# Altium schematic symbol library jlcpcb_2025_04_capacitors_extended_0402.schlib: 3594 symbols (part 16 of 20) (continued)
## GRM1555C1H111JA01D
designator C?  Capacitance: 110pF  (hidden comment: *)
Capacitor, Ceramic (MLCC), 110pF, ±5%, 50V, null, ±5%, SMD 0402; Manufacturer: Murata Electronics; Manufacturer Part Number: GRM1555C1H111JA01D; Package Size: 0402; JLCPCB Basic Part: No; JLCPCB Part Number: C185562; Supplier 1: LCSC; Category: Capacitors - MLCC; Supplier Part Number 1: C185562; Tolerance: ±5%; Voltage Rating: 50V; Temperature Coefficient: null; RoHS: Yes; ComponentLink1Description: Datasheet; ComponentLink1URL: https://wmsc.lcsc.com/wmsc/upload/file/pdf/v2/lcsc/2105241135_Murata-Electronics-GRM1555C1H111JA01D_C185562.pdf; ComponentLink2Description: JLCPCB Part URL; ComponentLink2URL: https://jlcpcb.com/partdetail/C185562; ComponentLink3Description: LCSC Part URL; ComponentLink3URL: https://lcsc.com/product-detail/Multilayer-Ceramic-Capacitors-MLCC---SMD-SMT_Murata-Electronics-Murata-Electronics-GRM1555C1H111JA01D_C185562.html
footprint CAP-0402 (0402 (1005M) Capacitor)
pins: 1, 2

## GRM1555C1H120GA01D
designator C?  Capacitance: 12pF  (hidden comment: *)
Capacitor, Ceramic (MLCC), 12pF, ±2%, 50V, null, ±2%, SMD 0402; Manufacturer: Murata Electronics; Manufacturer Part Number: GRM1555C1H120GA01D; Package Size: 0402; JLCPCB Basic Part: No; JLCPCB Part Number: C161527; Supplier 1: LCSC; Category: Capacitors - MLCC; Supplier Part Number 1: C161527; Tolerance: ±2%; Voltage Rating: 50V; Temperature Coefficient: null; RoHS: Yes; ComponentLink1Description: Datasheet; ComponentLink1URL: https://wmsc.lcsc.com/wmsc/upload/file/pdf/v2/lcsc/2010101433_Murata-Electronics-GRM1555C1H120GA01D_C161527.pdf; ComponentLink2Description: JLCPCB Part URL; ComponentLink2URL: https://jlcpcb.com/partdetail/C161527; ComponentLink3Description: LCSC Part URL; ComponentLink3URL: https://lcsc.com/product-detail/Multilayer-Ceramic-Capacitors-MLCC---SMD-SMT_Murata-Electronics-Murata-Electronics-GRM1555C1H120GA01D_C161527.html
footprint CAP-0402 (0402 (1005M) Capacitor)
pins: 1, 2

## GRM1555C1H120JA01D
designator C?  Capacitance: 12pF  (hidden comment: *)
Capacitor, Ceramic (MLCC), 12pF, ±5%, 50V, C0G, ±5%, SMD 0402; Manufacturer: Murata Electronics; Manufacturer Part Number: GRM1555C1H120JA01D; Package Size: 0402; JLCPCB Basic Part: No; JLCPCB Part Number: C76948; Supplier 1: LCSC; Category: Capacitors - MLCC; Supplier Part Number 1: C76948; Tolerance: ±5%; Voltage Rating: 50V; Temperature Coefficient: C0G; RoHS: Yes; ComponentLink1Description: Datasheet; ComponentLink1URL: https://wmsc.lcsc.com/wmsc/upload/file/pdf/v2/lcsc/1811081610_Murata-Electronics-GRM1555C1H120JA01D_C76948.pdf; ComponentLink2Description: JLCPCB Part URL; ComponentLink2URL: https://jlcpcb.com/partdetail/C76948; ComponentLink3Description: LCSC Part URL; ComponentLink3URL: https://lcsc.com/product-detail/Multilayer-Ceramic-Capacitors-MLCC---SMD-SMT_Murata-Electronics-Murata-Electronics-GRM1555C1H120JA01D_C76948.html
footprint CAP-0402 (0402 (1005M) Capacitor)
pins: 1, 2

## GRM1555C1H121FA01D
designator C?  Capacitance: 120pF  (hidden comment: *)
Capacitor, Ceramic (MLCC), 120pF, ±1%, null, null, ±1%, SMD 0402; Manufacturer: Murata Electronics; Manufacturer Part Number: GRM1555C1H121FA01D; Package Size: 0402; JLCPCB Basic Part: No; JLCPCB Part Number: C440164; Supplier 1: LCSC; Category: Capacitors - MLCC; Supplier Part Number 1: C440164; Tolerance: ±1%; Voltage Rating: null; Temperature Coefficient: null; RoHS: Yes; ComponentLink1Description: Datasheet; ComponentLink1URL: https://wmsc.lcsc.com/wmsc/upload/file/pdf/v2/lcsc/2304140030_Murata-Electronics-GRM1555C1H121FA01D_C440164.pdf; ComponentLink2Description: JLCPCB Part URL; ComponentLink2URL: https://jlcpcb.com/partdetail/C440164; ComponentLink3Description: LCSC Part URL; ComponentLink3URL: https://lcsc.com/product-detail/Multilayer-Ceramic-Capacitors-MLCC---SMD-SMT_Murata-Electronics-Murata-Electronics-GRM1555C1H121FA01D_C440164.html
footprint CAP-0402 (0402 (1005M) Capacitor)
pins: 1, 2

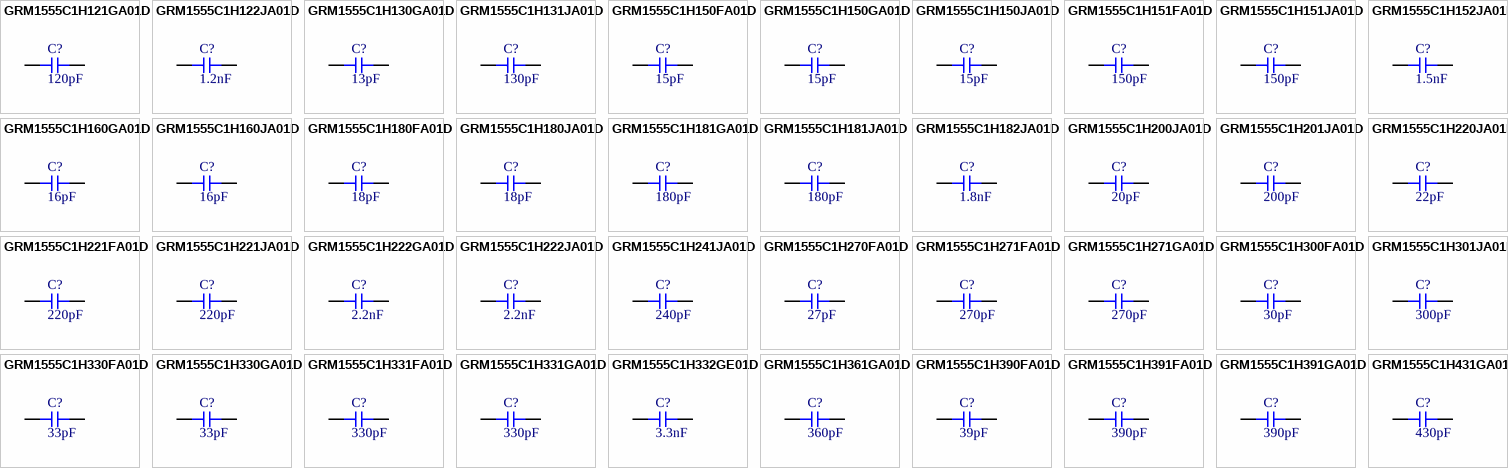
[diagram p73: symbols GRM1555C1H121GA01D to GRM1555C1H431GA01D]

## GRM1555C1H121GA01D
designator C?  Capacitance: 120pF  (hidden comment: *)
Capacitor, Ceramic (MLCC), 120pF, ±2%, null, null, ±2%, SMD 0402; Manufacturer: Murata Electronics; Manufacturer Part Number: GRM1555C1H121GA01D; Package Size: 0402; JLCPCB Basic Part: No; JLCPCB Part Number: C440165; Supplier 1: LCSC; Category: Capacitors - MLCC; Supplier Part Number 1: C440165; Tolerance: ±2%; Voltage Rating: null; Temperature Coefficient: null; RoHS: Yes; ComponentLink1Description: Datasheet; ComponentLink1URL: https://wmsc.lcsc.com/wmsc/upload/file/pdf/v2/lcsc/2304140030_Murata-Electronics-GRM1555C1H121GA01D_C440165.pdf; ComponentLink2Description: JLCPCB Part URL; ComponentLink2URL: https://jlcpcb.com/partdetail/C440165; ComponentLink3Description: LCSC Part URL; ComponentLink3URL: https://lcsc.com/product-detail/Multilayer-Ceramic-Capacitors-MLCC---SMD-SMT_Murata-Electronics-Murata-Electronics-GRM1555C1H121GA01D_C440165.html
footprint CAP-0402 (0402 (1005M) Capacitor)
pins: 1, 2

## GRM1555C1H122JA01D
designator C?  Capacitance: 1.2nF  (hidden comment: *)
Capacitor, Ceramic (MLCC), 1.2nF, ±5%, 50V, C0G, ±5%, SMD 0402; Manufacturer: Murata Electronics; Manufacturer Part Number: GRM1555C1H122JA01D; Package Size: 0402; JLCPCB Basic Part: No; JLCPCB Part Number: C3010430; Supplier 1: LCSC; Category: Capacitors - MLCC; Supplier Part Number 1: C3010430; Tolerance: ±5%; Voltage Rating: 50V; Temperature Coefficient: C0G; RoHS: Yes; ComponentLink1Description: Datasheet; ComponentLink1URL: https://wmsc.lcsc.com/wmsc/upload/file/pdf/v2/lcsc/2205101730_Murata-Electronics-GRM1555C1H122JA01D_C3010430.pdf; ComponentLink2Description: JLCPCB Part URL; ComponentLink2URL: https://jlcpcb.com/partdetail/C3010430; ComponentLink3Description: LCSC Part URL; ComponentLink3URL: https://lcsc.com/product-detail/Multilayer-Ceramic-Capacitors-MLCC---SMD-SMT_Murata-Electronics-Murata-Electronics-GRM1555C1H122JA01D_C3010430.html
footprint CAP-0402 (0402 (1005M) Capacitor)
pins: 1, 2

## GRM1555C1H130GA01D
designator C?  Capacitance: 13pF  (hidden comment: *)
Capacitor, Ceramic (MLCC), 13pF, ±2%, 50V, C0G, ±2%, SMD 0402; Manufacturer: Murata Electronics; Manufacturer Part Number: GRM1555C1H130GA01D; Package Size: 0402; JLCPCB Basic Part: No; JLCPCB Part Number: C161528; Supplier 1: LCSC; Category: Capacitors - MLCC; Supplier Part Number 1: C161528; Tolerance: ±2%; Voltage Rating: 50V; Temperature Coefficient: C0G; RoHS: Yes; ComponentLink1Description: Datasheet; ComponentLink1URL: https://wmsc.lcsc.com/wmsc/upload/file/pdf/v2/lcsc/2304140030_Murata-Electronics-GRM1555C1H130GA01D_C161528.pdf; ComponentLink2Description: JLCPCB Part URL; ComponentLink2URL: https://jlcpcb.com/partdetail/C161528; ComponentLink3Description: LCSC Part URL; ComponentLink3URL: https://lcsc.com/product-detail/Multilayer-Ceramic-Capacitors-MLCC---SMD-SMT_Murata-Electronics-Murata-Electronics-GRM1555C1H130GA01D_C161528.html
footprint CAP-0402 (0402 (1005M) Capacitor)
pins: 1, 2

## GRM1555C1H131JA01D
designator C?  Capacitance: 130pF  (hidden comment: *)
Capacitor, Ceramic (MLCC), 130pF, ±5%, null, null, ±5%, SMD 0402; Manufacturer: Murata Electronics; Manufacturer Part Number: GRM1555C1H131JA01D; Package Size: 0402; JLCPCB Basic Part: No; JLCPCB Part Number: C882544; Supplier 1: LCSC; Category: Capacitors - MLCC; Supplier Part Number 1: C882544; Tolerance: ±5%; Voltage Rating: null; Temperature Coefficient: null; RoHS: Yes; ComponentLink1Description: Datasheet; ComponentLink1URL: https://wmsc.lcsc.com/wmsc/upload/file/pdf/v2/lcsc/2201242130_Murata-Electronics-GRM1555C1H131JA01D_C882544.pdf; ComponentLink2Description: JLCPCB Part URL; ComponentLink2URL: https://jlcpcb.com/partdetail/C882544; ComponentLink3Description: LCSC Part URL; ComponentLink3URL: https://lcsc.com/product-detail/Multilayer-Ceramic-Capacitors-MLCC---SMD-SMT_Murata-Electronics-Murata-Electronics-GRM1555C1H131JA01D_C882544.html
footprint CAP-0402 (0402 (1005M) Capacitor)
pins: 1, 2

## GRM1555C1H150FA01D
designator C?  Capacitance: 15pF  (hidden comment: *)
Capacitor, Ceramic (MLCC), 15pF, ±1%, 50V, null, ±1%, SMD 0402; Manufacturer: Murata Electronics; Manufacturer Part Number: GRM1555C1H150FA01D; Package Size: 0402; JLCPCB Basic Part: No; JLCPCB Part Number: C161530; Supplier 1: LCSC; Category: Capacitors - MLCC; Supplier Part Number 1: C161530; Tolerance: ±1%; Voltage Rating: 50V; Temperature Coefficient: null; RoHS: Yes; ComponentLink1Description: Datasheet; ComponentLink1URL: https://wmsc.lcsc.com/wmsc/upload/file/pdf/v2/lcsc/2105241135_Murata-Electronics-GRM1555C1H150FA01D_C161530.pdf; ComponentLink2Description: JLCPCB Part URL; ComponentLink2URL: https://jlcpcb.com/partdetail/C161530; ComponentLink3Description: LCSC Part URL; ComponentLink3URL: https://lcsc.com/product-detail/Multilayer-Ceramic-Capacitors-MLCC---SMD-SMT_Murata-Electronics-Murata-Electronics-GRM1555C1H150FA01D_C161530.html
footprint CAP-0402 (0402 (1005M) Capacitor)
pins: 1, 2

## GRM1555C1H150GA01D
designator C?  Capacitance: 15pF  (hidden comment: *)
Capacitor, Ceramic (MLCC), 15pF, ±2%, 50V, null, ±2%, SMD 0402; Manufacturer: Murata Electronics; Manufacturer Part Number: GRM1555C1H150GA01D; Package Size: 0402; JLCPCB Basic Part: No; JLCPCB Part Number: C161531; Supplier 1: LCSC; Category: Capacitors - MLCC; Supplier Part Number 1: C161531; Tolerance: ±2%; Voltage Rating: 50V; Temperature Coefficient: null; RoHS: Yes; ComponentLink1Description: Datasheet; ComponentLink1URL: https://wmsc.lcsc.com/wmsc/upload/file/pdf/v2/lcsc/2105241135_Murata-Electronics-GRM1555C1H150GA01D_C161531.pdf; ComponentLink2Description: JLCPCB Part URL; ComponentLink2URL: https://jlcpcb.com/partdetail/C161531; ComponentLink3Description: LCSC Part URL; ComponentLink3URL: https://lcsc.com/product-detail/Multilayer-Ceramic-Capacitors-MLCC---SMD-SMT_Murata-Electronics-Murata-Electronics-GRM1555C1H150GA01D_C161531.html
footprint CAP-0402 (0402 (1005M) Capacitor)
pins: 1, 2

## GRM1555C1H150JA01D
designator C?  Capacitance: 15pF  (hidden comment: *)
Capacitor, Ceramic (MLCC), 15pF, ±5%, 50V, C0G, ±5%, SMD 0402; Manufacturer: Murata Electronics; Manufacturer Part Number: GRM1555C1H150JA01D; Package Size: 0402; JLCPCB Basic Part: No; JLCPCB Part Number: C76950; Supplier 1: LCSC; Category: Capacitors - MLCC; Supplier Part Number 1: C76950; Tolerance: ±5%; Voltage Rating: 50V; Temperature Coefficient: C0G; RoHS: Yes; ComponentLink1Description: Datasheet; ComponentLink1URL: https://wmsc.lcsc.com/wmsc/upload/file/pdf/v2/lcsc/1811081611_Murata-Electronics-GRM1555C1H150JA01D_C76950.pdf; ComponentLink2Description: JLCPCB Part URL; ComponentLink2URL: https://jlcpcb.com/partdetail/C76950; ComponentLink3Description: LCSC Part URL; ComponentLink3URL: https://lcsc.com/product-detail/Multilayer-Ceramic-Capacitors-MLCC---SMD-SMT_Murata-Electronics-Murata-Electronics-GRM1555C1H150JA01D_C76950.html
footprint CAP-0402 (0402 (1005M) Capacitor)
pins: 1, 2

## GRM1555C1H151FA01D
designator C?  Capacitance: 150pF  (hidden comment: *)
Capacitor, Ceramic (MLCC), 150pF, ±1%, 50V, C0G, ±1%, SMD 0402; Manufacturer: Murata Electronics; Manufacturer Part Number: GRM1555C1H151FA01D; Package Size: 0402; JLCPCB Basic Part: No; JLCPCB Part Number: C237333; Supplier 1: LCSC; Category: Capacitors - MLCC; Supplier Part Number 1: C237333; Tolerance: ±1%; Voltage Rating: 50V; Temperature Coefficient: C0G; RoHS: Yes; ComponentLink1Description: Datasheet; ComponentLink1URL: https://wmsc.lcsc.com/wmsc/upload/file/pdf/v2/lcsc/2304140030_Murata-Electronics-GRM1555C1H151FA01D_C237333.pdf; ComponentLink2Description: JLCPCB Part URL; ComponentLink2URL: https://jlcpcb.com/partdetail/C237333; ComponentLink3Description: LCSC Part URL; ComponentLink3URL: https://lcsc.com/product-detail/Multilayer-Ceramic-Capacitors-MLCC---SMD-SMT_Murata-Electronics-Murata-Electronics-GRM1555C1H151FA01D_C237333.html
footprint CAP-0402 (0402 (1005M) Capacitor)
pins: 1, 2

## GRM1555C1H151JA01D
designator C?  Capacitance: 150pF  (hidden comment: *)
Capacitor, Ceramic (MLCC), 150pF, ±5%, 50V, C0G, ±5%, SMD 0402; Manufacturer: Murata Electronics; Manufacturer Part Number: GRM1555C1H151JA01D; Package Size: 0402; JLCPCB Basic Part: No; JLCPCB Part Number: C76951; Supplier 1: LCSC; Category: Capacitors - MLCC; Supplier Part Number 1: C76951; Tolerance: ±5%; Voltage Rating: 50V; Temperature Coefficient: C0G; RoHS: Yes; ComponentLink1Description: Datasheet; ComponentLink1URL: https://wmsc.lcsc.com/wmsc/upload/file/pdf/v2/lcsc/1811081611_Murata-Electronics-GRM1555C1H151JA01D_C76951.pdf; ComponentLink2Description: JLCPCB Part URL; ComponentLink2URL: https://jlcpcb.com/partdetail/C76951; ComponentLink3Description: LCSC Part URL; ComponentLink3URL: https://lcsc.com/product-detail/Multilayer-Ceramic-Capacitors-MLCC---SMD-SMT_Murata-Electronics-Murata-Electronics-GRM1555C1H151JA01D_C76951.html
footprint CAP-0402 (0402 (1005M) Capacitor)
pins: 1, 2

## GRM1555C1H152JA01D
designator C?  Capacitance: 1.5nF  (hidden comment: *)
Capacitor, Ceramic (MLCC), 1.5nF, ±5%, null, null, ±5%, SMD 0402; Manufacturer: Murata Electronics; Manufacturer Part Number: GRM1555C1H152JA01D; Package Size: 0402; JLCPCB Basic Part: No; JLCPCB Part Number: C668348; Supplier 1: LCSC; Category: Capacitors - MLCC; Supplier Part Number 1: C668348; Tolerance: ±5%; Voltage Rating: null; Temperature Coefficient: null; RoHS: Yes; ComponentLink1Description: Datasheet; ComponentLink1URL: https://wmsc.lcsc.com/wmsc/upload/file/pdf/v2/lcsc/2201131030_Murata-Electronics-GRM1555C1H152JA01D_C668348.pdf; ComponentLink2Description: JLCPCB Part URL; ComponentLink2URL: https://jlcpcb.com/partdetail/C668348; ComponentLink3Description: LCSC Part URL; ComponentLink3URL: https://lcsc.com/product-detail/Multilayer-Ceramic-Capacitors-MLCC---SMD-SMT_Murata-Electronics-Murata-Electronics-GRM1555C1H152JA01D_C668348.html
footprint CAP-0402 (0402 (1005M) Capacitor)
pins: 1, 2

## GRM1555C1H160GA01D
designator C?  Capacitance: 16pF  (hidden comment: *)
Capacitor, Ceramic (MLCC), 16pF, ±2%, 50V, C0G, ±2%, SMD 0402; Manufacturer: Murata Electronics; Manufacturer Part Number: GRM1555C1H160GA01D; Package Size: 0402; JLCPCB Basic Part: No; JLCPCB Part Number: C161533; Supplier 1: LCSC; Category: Capacitors - MLCC; Supplier Part Number 1: C161533; Tolerance: ±2%; Voltage Rating: 50V; Temperature Coefficient: C0G; RoHS: Yes; ComponentLink1Description: Datasheet; ComponentLink1URL: https://wmsc.lcsc.com/wmsc/upload/file/pdf/v2/lcsc/2304140030_Murata-Electronics-GRM1555C1H160GA01D_C161533.pdf; ComponentLink2Description: JLCPCB Part URL; ComponentLink2URL: https://jlcpcb.com/partdetail/C161533; ComponentLink3Description: LCSC Part URL; ComponentLink3URL: https://lcsc.com/product-detail/Multilayer-Ceramic-Capacitors-MLCC---SMD-SMT_Murata-Electronics-Murata-Electronics-GRM1555C1H160GA01D_C161533.html
footprint CAP-0402 (0402 (1005M) Capacitor)
pins: 1, 2

## GRM1555C1H160JA01D
designator C?  Capacitance: 16pF  (hidden comment: *)
Capacitor, Ceramic (MLCC), 16pF, ±5%, 50V, C0G, ±5%, SMD 0402; Manufacturer: Murata Electronics; Manufacturer Part Number: GRM1555C1H160JA01D; Package Size: 0402; JLCPCB Basic Part: No; JLCPCB Part Number: C85936; Supplier 1: LCSC; Category: Capacitors - MLCC; Supplier Part Number 1: C85936; Tolerance: ±5%; Voltage Rating: 50V; Temperature Coefficient: C0G; RoHS: Yes; ComponentLink1Description: Datasheet; ComponentLink1URL: https://wmsc.lcsc.com/wmsc/upload/file/pdf/v2/lcsc/2304140030_Murata-Electronics-GRM1555C1H160JA01D_C85936.pdf; ComponentLink2Description: JLCPCB Part URL; ComponentLink2URL: https://jlcpcb.com/partdetail/C85936; ComponentLink3Description: LCSC Part URL; ComponentLink3URL: https://lcsc.com/product-detail/Multilayer-Ceramic-Capacitors-MLCC---SMD-SMT_Murata-Electronics-Murata-Electronics-GRM1555C1H160JA01D_C85936.html
footprint CAP-0402 (0402 (1005M) Capacitor)
pins: 1, 2

## GRM1555C1H180FA01D
designator C?  Capacitance: 18pF  (hidden comment: *)
Capacitor, Ceramic (MLCC), 18pF, ±1%, 50V, C0G, ±1%, SMD 0402; Manufacturer: Murata Electronics; Manufacturer Part Number: GRM1555C1H180FA01D; Package Size: 0402; JLCPCB Basic Part: No; JLCPCB Part Number: C161534; Supplier 1: LCSC; Category: Capacitors - MLCC; Supplier Part Number 1: C161534; Tolerance: ±1%; Voltage Rating: 50V; Temperature Coefficient: C0G; RoHS: Yes; ComponentLink1Description: Datasheet; ComponentLink1URL: https://wmsc.lcsc.com/wmsc/upload/file/pdf/v2/lcsc/1811081513_Murata-Electronics-GRM1555C1H180FA01D_C161534.pdf; ComponentLink2Description: JLCPCB Part URL; ComponentLink2URL: https://jlcpcb.com/partdetail/C161534; ComponentLink3Description: LCSC Part URL; ComponentLink3URL: https://lcsc.com/product-detail/Multilayer-Ceramic-Capacitors-MLCC---SMD-SMT_Murata-Electronics-Murata-Electronics-GRM1555C1H180FA01D_C161534.html
footprint CAP-0402 (0402 (1005M) Capacitor)
pins: 1, 2

## GRM1555C1H180JA01D
designator C?  Capacitance: 18pF  (hidden comment: *)
Capacitor, Ceramic (MLCC), 18pF, ±5%, 50V, C0G, ±5%, SMD 0402; Manufacturer: Murata Electronics; Manufacturer Part Number: GRM1555C1H180JA01D; Package Size: 0402; JLCPCB Basic Part: No; JLCPCB Part Number: C33149; Supplier 1: LCSC; Category: Capacitors - MLCC; Supplier Part Number 1: C33149; Tolerance: ±5%; Voltage Rating: 50V; Temperature Coefficient: C0G; RoHS: Yes; ComponentLink1Description: Datasheet; ComponentLink1URL: https://wmsc.lcsc.com/wmsc/upload/file/pdf/v2/lcsc/1811081612_Murata-Electronics-GRM1555C1H180JA01D_C33149.pdf; ComponentLink2Description: JLCPCB Part URL; ComponentLink2URL: https://jlcpcb.com/partdetail/C33149; ComponentLink3Description: LCSC Part URL; ComponentLink3URL: https://lcsc.com/product-detail/Multilayer-Ceramic-Capacitors-MLCC---SMD-SMT_Murata-Electronics-Murata-Electronics-GRM1555C1H180JA01D_C33149.html
footprint CAP-0402 (0402 (1005M) Capacitor)
pins: 1, 2

## GRM1555C1H181GA01D
designator C?  Capacitance: 180pF  (hidden comment: *)
Capacitor, Ceramic (MLCC), 180pF, ±2%, 50V, C0G, ±2%, SMD 0402; Manufacturer: Murata Electronics; Manufacturer Part Number: GRM1555C1H181GA01D; Package Size: 0402; JLCPCB Basic Part: No; JLCPCB Part Number: C237508; Supplier 1: LCSC; Category: Capacitors - MLCC; Supplier Part Number 1: C237508; Tolerance: ±2%; Voltage Rating: 50V; Temperature Coefficient: C0G; RoHS: Yes; ComponentLink1Description: Datasheet; ComponentLink1URL: https://wmsc.lcsc.com/wmsc/upload/file/pdf/v2/lcsc/2304140030_Murata-Electronics-GRM1555C1H181GA01D_C237508.pdf; ComponentLink2Description: JLCPCB Part URL; ComponentLink2URL: https://jlcpcb.com/partdetail/C237508; ComponentLink3Description: LCSC Part URL; ComponentLink3URL: https://lcsc.com/product-detail/Multilayer-Ceramic-Capacitors-MLCC---SMD-SMT_Murata-Electronics-Murata-Electronics-GRM1555C1H181GA01D_C237508.html
footprint CAP-0402 (0402 (1005M) Capacitor)
pins: 1, 2

## GRM1555C1H181JA01D
designator C?  Capacitance: 180pF  (hidden comment: *)
Capacitor, Ceramic (MLCC), 180pF, ±5%, 50V, C0G, ±5%, SMD 0402; Manufacturer: Murata Electronics; Manufacturer Part Number: GRM1555C1H181JA01D; Package Size: 0402; JLCPCB Basic Part: No; JLCPCB Part Number: C97862; Supplier 1: LCSC; Category: Capacitors - MLCC; Supplier Part Number 1: C97862; Tolerance: ±5%; Voltage Rating: 50V; Temperature Coefficient: C0G; RoHS: Yes; ComponentLink1Description: Datasheet; ComponentLink1URL: https://wmsc.lcsc.com/wmsc/upload/file/pdf/v2/lcsc/1811081610_Murata-Electronics-GRM1555C1H181JA01D_C97862.pdf; ComponentLink2Description: JLCPCB Part URL; ComponentLink2URL: https://jlcpcb.com/partdetail/C97862; ComponentLink3Description: LCSC Part URL; ComponentLink3URL: https://lcsc.com/product-detail/Multilayer-Ceramic-Capacitors-MLCC---SMD-SMT_Murata-Electronics-Murata-Electronics-GRM1555C1H181JA01D_C97862.html
footprint CAP-0402 (0402 (1005M) Capacitor)
pins: 1, 2

## GRM1555C1H182JA01D
designator C?  Capacitance: 1.8nF  (hidden comment: *)
Capacitor, Ceramic (MLCC), 1.8nF, ±5%, null, null, ±5%, SMD 0402; Manufacturer: Murata Electronics; Manufacturer Part Number: GRM1555C1H182JA01D; Package Size: 0402; JLCPCB Basic Part: No; JLCPCB Part Number: C385028; Supplier 1: LCSC; Category: Capacitors - MLCC; Supplier Part Number 1: C385028; Tolerance: ±5%; Voltage Rating: null; Temperature Coefficient: null; RoHS: Yes; ComponentLink1Description: Datasheet; ComponentLink1URL: https://wmsc.lcsc.com/wmsc/upload/file/pdf/v2/lcsc/2104021534_Murata-Electronics-GRM1555C1H182JA01D_C385028.pdf; ComponentLink2Description: JLCPCB Part URL; ComponentLink2URL: https://jlcpcb.com/partdetail/C385028; ComponentLink3Description: LCSC Part URL; ComponentLink3URL: https://lcsc.com/product-detail/Multilayer-Ceramic-Capacitors-MLCC---SMD-SMT_Murata-Electronics-Murata-Electronics-GRM1555C1H182JA01D_C385028.html
footprint CAP-0402 (0402 (1005M) Capacitor)
pins: 1, 2

## GRM1555C1H200JA01D
designator C?  Capacitance: 20pF  (hidden comment: *)
Capacitor, Ceramic (MLCC), 20pF, ±5%, 50V, C0G, ±5%, SMD 0402; Manufacturer: Murata Electronics; Manufacturer Part Number: GRM1555C1H200JA01D; Package Size: 0402; JLCPCB Basic Part: No; JLCPCB Part Number: C76959; Supplier 1: LCSC; Category: Capacitors - MLCC; Supplier Part Number 1: C76959; Tolerance: ±5%; Voltage Rating: 50V; Temperature Coefficient: C0G; RoHS: Yes; ComponentLink1Description: Datasheet; ComponentLink1URL: https://wmsc.lcsc.com/wmsc/upload/file/pdf/v2/lcsc/1811081611_Murata-Electronics-GRM1555C1H200JA01D_C76959.pdf; ComponentLink2Description: JLCPCB Part URL; ComponentLink2URL: https://jlcpcb.com/partdetail/C76959; ComponentLink3Description: LCSC Part URL; ComponentLink3URL: https://lcsc.com/product-detail/Multilayer-Ceramic-Capacitors-MLCC---SMD-SMT_Murata-Electronics-Murata-Electronics-GRM1555C1H200JA01D_C76959.html
footprint CAP-0402 (0402 (1005M) Capacitor)
pins: 1, 2

## GRM1555C1H201JA01D
designator C?  Capacitance: 200pF  (hidden comment: *)
Capacitor, Ceramic (MLCC), 200pF, ±5%, null, null, ±5%, SMD 0402; Manufacturer: Murata Electronics; Manufacturer Part Number: GRM1555C1H201JA01D; Package Size: 0402; JLCPCB Basic Part: No; JLCPCB Part Number: C701303; Supplier 1: LCSC; Category: Capacitors - MLCC; Supplier Part Number 1: C701303; Tolerance: ±5%; Voltage Rating: null; Temperature Coefficient: null; RoHS: Yes; ComponentLink1Description: Datasheet; ComponentLink1URL: https://wmsc.lcsc.com/wmsc/upload/file/pdf/v2/lcsc/2304140030_Murata-Electronics-GRM1555C1H201JA01D_C701303.pdf; ComponentLink2Description: JLCPCB Part URL; ComponentLink2URL: https://jlcpcb.com/partdetail/C701303; ComponentLink3Description: LCSC Part URL; ComponentLink3URL: https://lcsc.com/product-detail/Multilayer-Ceramic-Capacitors-MLCC---SMD-SMT_Murata-Electronics-Murata-Electronics-GRM1555C1H201JA01D_C701303.html
footprint CAP-0402 (0402 (1005M) Capacitor)
pins: 1, 2

## GRM1555C1H220JA01D
designator C?  Capacitance: 22pF  (hidden comment: *)
Capacitor, Ceramic (MLCC), 22pF, ±5%, 50V, C0G, ±5%, SMD 0402; Manufacturer: Murata Electronics; Manufacturer Part Number: GRM1555C1H220JA01D; Package Size: 0402; JLCPCB Basic Part: No; JLCPCB Part Number: C76960; Supplier 1: LCSC; Category: Capacitors - MLCC; Supplier Part Number 1: C76960; Tolerance: ±5%; Voltage Rating: 50V; Temperature Coefficient: C0G; RoHS: Yes; ComponentLink1Description: Datasheet; ComponentLink1URL: https://wmsc.lcsc.com/wmsc/upload/file/pdf/v2/lcsc/1811081616_Murata-Electronics-GRM1555C1H220JA01D_C76960.pdf; ComponentLink2Description: JLCPCB Part URL; ComponentLink2URL: https://jlcpcb.com/partdetail/C76960; ComponentLink3Description: LCSC Part URL; ComponentLink3URL: https://lcsc.com/product-detail/Multilayer-Ceramic-Capacitors-MLCC---SMD-SMT_Murata-Electronics-Murata-Electronics-GRM1555C1H220JA01D_C76960.html
footprint CAP-0402 (0402 (1005M) Capacitor)
pins: 1, 2

## GRM1555C1H221FA01D
designator C?  Capacitance: 220pF  (hidden comment: *)
Capacitor, Ceramic (MLCC), 220pF, ±1%, 50V, C0G, ±1%, SMD 0402; Manufacturer: Murata Electronics; Manufacturer Part Number: GRM1555C1H221FA01D; Package Size: 0402; JLCPCB Basic Part: No; JLCPCB Part Number: C2987941; Supplier 1: LCSC; Category: Capacitors - MLCC; Supplier Part Number 1: C2987941; Tolerance: ±1%; Voltage Rating: 50V; Temperature Coefficient: C0G; RoHS: Yes; ComponentLink1Description: Datasheet; ComponentLink1URL: https://wmsc.lcsc.com/wmsc/upload/file/pdf/v2/lcsc/2206211730_Murata-Electronics-GRM1555C1H221FA01D_C2987941.pdf; ComponentLink2Description: JLCPCB Part URL; ComponentLink2URL: https://jlcpcb.com/partdetail/C2987941; ComponentLink3Description: LCSC Part URL; ComponentLink3URL: https://lcsc.com/product-detail/Multilayer-Ceramic-Capacitors-MLCC---SMD-SMT_Murata-Electronics-Murata-Electronics-GRM1555C1H221FA01D_C2987941.html
footprint CAP-0402 (0402 (1005M) Capacitor)
pins: 1, 2

## GRM1555C1H221JA01D
designator C?  Capacitance: 220pF  (hidden comment: *)
Capacitor, Ceramic (MLCC), 220pF, ±5%, 50V, C0G, ±5%, SMD 0402; Manufacturer: Murata Electronics; Manufacturer Part Number: GRM1555C1H221JA01D; Package Size: 0402; JLCPCB Basic Part: No; JLCPCB Part Number: C71693; Supplier 1: LCSC; Category: Capacitors - MLCC; Supplier Part Number 1: C71693; Tolerance: ±5%; Voltage Rating: 50V; Temperature Coefficient: C0G; RoHS: Yes; ComponentLink1Description: Datasheet; ComponentLink1URL: https://wmsc.lcsc.com/wmsc/upload/file/pdf/v2/lcsc/1811081614_Murata-Electronics-GRM1555C1H221JA01D_C71693.pdf; ComponentLink2Description: JLCPCB Part URL; ComponentLink2URL: https://jlcpcb.com/partdetail/C71693; ComponentLink3Description: LCSC Part URL; ComponentLink3URL: https://lcsc.com/product-detail/Multilayer-Ceramic-Capacitors-MLCC---SMD-SMT_Murata-Electronics-Murata-Electronics-GRM1555C1H221JA01D_C71693.html
footprint CAP-0402 (0402 (1005M) Capacitor)
pins: 1, 2

## GRM1555C1H222GA01D
designator C?  Capacitance: 2.2nF  (hidden comment: *)
Capacitor, Ceramic (MLCC), 2.2nF, 50V, C0G, SMD 0402; Manufacturer: Murata Electronics; Manufacturer Part Number: GRM1555C1H222GA01D; Package Size: 0402; JLCPCB Basic Part: No; JLCPCB Part Number: C2987940; Supplier 1: LCSC; Category: Capacitors - MLCC; Supplier Part Number 1: C2987940; Voltage Rating: 50V; Temperature Coefficient: C0G; RoHS: Yes; ComponentLink1Description: Datasheet; ComponentLink1URL: https://wmsc.lcsc.com/wmsc/upload/file/pdf/v2/lcsc/2206211730_Murata-Electronics-GRM1555C1H222GA01D_C2987940.pdf; ComponentLink2Description: JLCPCB Part URL; ComponentLink2URL: https://jlcpcb.com/partdetail/C2987940; ComponentLink3Description: LCSC Part URL; ComponentLink3URL: https://lcsc.com/product-detail/Multilayer-Ceramic-Capacitors-MLCC---SMD-SMT_Murata-Electronics-Murata-Electronics-GRM1555C1H222GA01D_C2987940.html
footprint CAP-0402 (0402 (1005M) Capacitor)
pins: 1, 2

## GRM1555C1H222JA01D
designator C?  Capacitance: 2.2nF  (hidden comment: *)
Capacitor, Ceramic (MLCC), 2.2nF, ±5%, 50V, ±5%, SMD 0402; Manufacturer: Murata Electronics; Manufacturer Part Number: GRM1555C1H222JA01D; Package Size: 0402; JLCPCB Basic Part: No; JLCPCB Part Number: C385029; Supplier 1: LCSC; Category: Capacitors - MLCC; Supplier Part Number 1: C385029; Tolerance: ±5%; Voltage Rating: 50V; RoHS: Yes; ComponentLink1Description: Datasheet; ComponentLink1URL: https://wmsc.lcsc.com/wmsc/upload/file/pdf/v2/lcsc/2108182030_Murata-Electronics-GRM1555C1H222JA01D_C385029.pdf; ComponentLink2Description: JLCPCB Part URL; ComponentLink2URL: https://jlcpcb.com/partdetail/C385029; ComponentLink3Description: LCSC Part URL; ComponentLink3URL: https://lcsc.com/product-detail/Multilayer-Ceramic-Capacitors-MLCC---SMD-SMT_Murata-Electronics-Murata-Electronics-GRM1555C1H222JA01D_C385029.html
footprint CAP-0402 (0402 (1005M) Capacitor)
pins: 1, 2

## GRM1555C1H241JA01D
designator C?  Capacitance: 240pF  (hidden comment: *)
Capacitor, Ceramic (MLCC), 240pF, ±5%, null, null, ±5%, SMD 0402; Manufacturer: Murata Electronics; Manufacturer Part Number: GRM1555C1H241JA01D; Package Size: 0402; JLCPCB Basic Part: No; JLCPCB Part Number: C440166; Supplier 1: LCSC; Category: Capacitors - MLCC; Supplier Part Number 1: C440166; Tolerance: ±5%; Voltage Rating: null; Temperature Coefficient: null; RoHS: Yes; ComponentLink1Description: Datasheet; ComponentLink1URL: https://wmsc.lcsc.com/wmsc/upload/file/pdf/v2/lcsc/2304140030_Murata-Electronics-GRM1555C1H241JA01D_C440166.pdf; ComponentLink2Description: JLCPCB Part URL; ComponentLink2URL: https://jlcpcb.com/partdetail/C440166; ComponentLink3Description: LCSC Part URL; ComponentLink3URL: https://lcsc.com/product-detail/Multilayer-Ceramic-Capacitors-MLCC---SMD-SMT_Murata-Electronics-Murata-Electronics-GRM1555C1H241JA01D_C440166.html
footprint CAP-0402 (0402 (1005M) Capacitor)
pins: 1, 2

## GRM1555C1H270FA01D
designator C?  Capacitance: 27pF  (hidden comment: *)
Capacitor, Ceramic (MLCC), 27pF, ±1%, 50V, null, ±1%, SMD 0402; Manufacturer: Murata Electronics; Manufacturer Part Number: GRM1555C1H270FA01D; Package Size: 0402; JLCPCB Basic Part: No; JLCPCB Part Number: C161544; Supplier 1: LCSC; Category: Capacitors - MLCC; Supplier Part Number 1: C161544; Tolerance: ±1%; Voltage Rating: 50V; Temperature Coefficient: null; RoHS: Yes; ComponentLink1Description: Datasheet; ComponentLink1URL: https://wmsc.lcsc.com/wmsc/upload/file/pdf/v2/lcsc/2009211103_Murata-Electronics-GRM1555C1H270FA01D_C161544.pdf; ComponentLink2Description: JLCPCB Part URL; ComponentLink2URL: https://jlcpcb.com/partdetail/C161544; ComponentLink3Description: LCSC Part URL; ComponentLink3URL: https://lcsc.com/product-detail/Multilayer-Ceramic-Capacitors-MLCC---SMD-SMT_Murata-Electronics-Murata-Electronics-GRM1555C1H270FA01D_C161544.html
footprint CAP-0402 (0402 (1005M) Capacitor)
pins: 1, 2

## GRM1555C1H271FA01D
designator C?  Capacitance: 270pF  (hidden comment: *)
Capacitor, Ceramic (MLCC), 270pF, ±1%, 50V, C0G, ±1%, SMD 0402; Manufacturer: Murata Electronics; Manufacturer Part Number: GRM1555C1H271FA01D; Package Size: 0402; JLCPCB Basic Part: No; JLCPCB Part Number: C161545; Supplier 1: LCSC; Category: Capacitors - MLCC; Supplier Part Number 1: C161545; Tolerance: ±1%; Voltage Rating: 50V; Temperature Coefficient: C0G; RoHS: Yes; ComponentLink1Description: Datasheet; ComponentLink1URL: https://wmsc.lcsc.com/wmsc/upload/file/pdf/v2/lcsc/2304140030_Murata-Electronics-GRM1555C1H271FA01D_C161545.pdf; ComponentLink2Description: JLCPCB Part URL; ComponentLink2URL: https://jlcpcb.com/partdetail/C161545; ComponentLink3Description: LCSC Part URL; ComponentLink3URL: https://lcsc.com/product-detail/Multilayer-Ceramic-Capacitors-MLCC---SMD-SMT_Murata-Electronics-Murata-Electronics-GRM1555C1H271FA01D_C161545.html
footprint CAP-0402 (0402 (1005M) Capacitor)
pins: 1, 2

## GRM1555C1H271GA01D
designator C?  Capacitance: 270pF  (hidden comment: *)
Capacitor, Ceramic (MLCC), 270pF, ±2%, 50V, C0G, ±2%, SMD 0402; Manufacturer: Murata Electronics; Manufacturer Part Number: GRM1555C1H271GA01D; Package Size: 0402; JLCPCB Basic Part: No; JLCPCB Part Number: C161546; Supplier 1: LCSC; Category: Capacitors - MLCC; Supplier Part Number 1: C161546; Tolerance: ±2%; Voltage Rating: 50V; Temperature Coefficient: C0G; RoHS: Yes; ComponentLink1Description: Datasheet; ComponentLink1URL: https://wmsc.lcsc.com/wmsc/upload/file/pdf/v2/lcsc/1912111437_Murata-Electronics-GRM1555C1H271GA01D_C161546.pdf; ComponentLink2Description: JLCPCB Part URL; ComponentLink2URL: https://jlcpcb.com/partdetail/C161546; ComponentLink3Description: LCSC Part URL; ComponentLink3URL: https://lcsc.com/product-detail/Multilayer-Ceramic-Capacitors-MLCC---SMD-SMT_Murata-Electronics-Murata-Electronics-GRM1555C1H271GA01D_C161546.html
footprint CAP-0402 (0402 (1005M) Capacitor)
pins: 1, 2

## GRM1555C1H300FA01D
designator C?  Capacitance: 30pF  (hidden comment: *)
Capacitor, Ceramic (MLCC), 30pF, ±1%, 50V, C0G, ±1%, SMD 0402; Manufacturer: Murata Electronics; Manufacturer Part Number: GRM1555C1H300FA01D; Package Size: 0402; JLCPCB Basic Part: No; JLCPCB Part Number: C161552; Supplier 1: LCSC; Category: Capacitors - MLCC; Supplier Part Number 1: C161552; Tolerance: ±1%; Voltage Rating: 50V; Temperature Coefficient: C0G; RoHS: Yes; ComponentLink1Description: Datasheet; ComponentLink1URL: https://wmsc.lcsc.com/wmsc/upload/file/pdf/v2/lcsc/2304140030_Murata-Electronics-GRM1555C1H300FA01D_C161552.pdf; ComponentLink2Description: JLCPCB Part URL; ComponentLink2URL: https://jlcpcb.com/partdetail/C161552; ComponentLink3Description: LCSC Part URL; ComponentLink3URL: https://lcsc.com/product-detail/Multilayer-Ceramic-Capacitors-MLCC---SMD-SMT_Murata-Electronics-Murata-Electronics-GRM1555C1H300FA01D_C161552.html
footprint CAP-0402 (0402 (1005M) Capacitor)
pins: 1, 2

## GRM1555C1H301JA01D
designator C?  Capacitance: 300pF  (hidden comment: *)
Capacitor, Ceramic (MLCC), 300pF, ±5%, 50V, C0G, ±5%, SMD 0402; Manufacturer: Murata Electronics; Manufacturer Part Number: GRM1555C1H301JA01D; Package Size: 0402; JLCPCB Basic Part: No; JLCPCB Part Number: C162095; Supplier 1: LCSC; Category: Capacitors - MLCC; Supplier Part Number 1: C162095; Tolerance: ±5%; Voltage Rating: 50V; Temperature Coefficient: C0G; RoHS: Yes; ComponentLink1Description: Datasheet; ComponentLink1URL: https://wmsc.lcsc.com/wmsc/upload/file/pdf/v2/lcsc/1811081547_Murata-Electronics-GRM1555C1H301JA01D_C162095.pdf; ComponentLink2Description: JLCPCB Part URL; ComponentLink2URL: https://jlcpcb.com/partdetail/C162095; ComponentLink3Description: LCSC Part URL; ComponentLink3URL: https://lcsc.com/product-detail/Multilayer-Ceramic-Capacitors-MLCC---SMD-SMT_Murata-Electronics-Murata-Electronics-GRM1555C1H301JA01D_C162095.html
footprint CAP-0402 (0402 (1005M) Capacitor)
pins: 1, 2

## GRM1555C1H330FA01D
designator C?  Capacitance: 33pF  (hidden comment: *)
Capacitor, Ceramic (MLCC), 33pF, ±1%, 50V, null, ±1%, SMD 0402; Manufacturer: Murata Electronics; Manufacturer Part Number: GRM1555C1H330FA01D; Package Size: 0402; JLCPCB Basic Part: No; JLCPCB Part Number: C162096; Supplier 1: LCSC; Category: Capacitors - MLCC; Supplier Part Number 1: C162096; Tolerance: ±1%; Voltage Rating: 50V; Temperature Coefficient: null; RoHS: Yes; ComponentLink1Description: Datasheet; ComponentLink1URL: https://wmsc.lcsc.com/wmsc/upload/file/pdf/v2/lcsc/2012211404_Murata-Electronics-GRM1555C1H330FA01D_C162096.pdf; ComponentLink2Description: JLCPCB Part URL; ComponentLink2URL: https://jlcpcb.com/partdetail/C162096; ComponentLink3Description: LCSC Part URL; ComponentLink3URL: https://lcsc.com/product-detail/Multilayer-Ceramic-Capacitors-MLCC---SMD-SMT_Murata-Electronics-Murata-Electronics-GRM1555C1H330FA01D_C162096.html
footprint CAP-0402 (0402 (1005M) Capacitor)
pins: 1, 2

## GRM1555C1H330GA01D
designator C?  Capacitance: 33pF  (hidden comment: *)
Capacitor, Ceramic (MLCC), 33pF, ±2%, 50V, C0G, ±2%, SMD 0402; Manufacturer: Murata Electronics; Manufacturer Part Number: GRM1555C1H330GA01D; Package Size: 0402; JLCPCB Basic Part: No; JLCPCB Part Number: C162097; Supplier 1: LCSC; Category: Capacitors - MLCC; Supplier Part Number 1: C162097; Tolerance: ±2%; Voltage Rating: 50V; Temperature Coefficient: C0G; RoHS: Yes; ComponentLink1Description: Datasheet; ComponentLink1URL: https://wmsc.lcsc.com/wmsc/upload/file/pdf/v2/lcsc/2401240940_Murata-Electronics-GRM1555C1H330GA01D_C162097.pdf; ComponentLink2Description: JLCPCB Part URL; ComponentLink2URL: https://jlcpcb.com/partdetail/C162097; ComponentLink3Description: LCSC Part URL; ComponentLink3URL: https://lcsc.com/product-detail/Multilayer-Ceramic-Capacitors-MLCC---SMD-SMT_Murata-Electronics-Murata-Electronics-GRM1555C1H330GA01D_C162097.html
footprint CAP-0402 (0402 (1005M) Capacitor)
pins: 1, 2

## GRM1555C1H331FA01D
designator C?  Capacitance: 330pF  (hidden comment: *)
Capacitor, Ceramic (MLCC), 330pF, ±1%, 50V, C0G, ±1%, SMD 0402; Manufacturer: Murata Electronics; Manufacturer Part Number: GRM1555C1H331FA01D; Package Size: 0402; JLCPCB Basic Part: No; JLCPCB Part Number: C710844; Supplier 1: LCSC; Category: Capacitors - MLCC; Supplier Part Number 1: C710844; Tolerance: ±1%; Voltage Rating: 50V; Temperature Coefficient: C0G; RoHS: Yes; ComponentLink1Description: Datasheet; ComponentLink1URL: https://wmsc.lcsc.com/wmsc/upload/file/pdf/v2/lcsc/2210190600_Murata-Electronics-GRM1555C1H331FA01D_C710844.pdf; ComponentLink2Description: JLCPCB Part URL; ComponentLink2URL: https://jlcpcb.com/partdetail/C710844; ComponentLink3Description: LCSC Part URL; ComponentLink3URL: https://lcsc.com/product-detail/Multilayer-Ceramic-Capacitors-MLCC---SMD-SMT_Murata-Electronics-Murata-Electronics-GRM1555C1H331FA01D_C710844.html
footprint CAP-0402 (0402 (1005M) Capacitor)
pins: 1, 2

## GRM1555C1H331GA01D
designator C?  Capacitance: 330pF  (hidden comment: *)
Capacitor, Ceramic (MLCC), 330pF, ±2%, 50V, C0G, ±2%, SMD 0402; Manufacturer: Murata Electronics; Manufacturer Part Number: GRM1555C1H331GA01D; Package Size: 0402; JLCPCB Basic Part: No; JLCPCB Part Number: C237507; Supplier 1: LCSC; Category: Capacitors - MLCC; Supplier Part Number 1: C237507; Tolerance: ±2%; Voltage Rating: 50V; Temperature Coefficient: C0G; RoHS: Yes; ComponentLink1Description: Datasheet; ComponentLink1URL: https://wmsc.lcsc.com/wmsc/upload/file/pdf/v2/lcsc/2304140030_Murata-Electronics-GRM1555C1H331GA01D_C237507.pdf; ComponentLink2Description: JLCPCB Part URL; ComponentLink2URL: https://jlcpcb.com/partdetail/C237507; ComponentLink3Description: LCSC Part URL; ComponentLink3URL: https://lcsc.com/product-detail/Multilayer-Ceramic-Capacitors-MLCC---SMD-SMT_Murata-Electronics-Murata-Electronics-GRM1555C1H331GA01D_C237507.html
footprint CAP-0402 (0402 (1005M) Capacitor)
pins: 1, 2

## GRM1555C1H332GE01D
designator C?  Capacitance: 3.3nF  (hidden comment: *)
Capacitor, Ceramic (MLCC), 3.3nF, ±2%, 50V, C0G, ±2%, SMD 0402; Manufacturer: Murata Electronics; Manufacturer Part Number: GRM1555C1H332GE01D; Package Size: 0402; JLCPCB Basic Part: No; JLCPCB Part Number: C3881585; Supplier 1: LCSC; Category: Capacitors - MLCC; Supplier Part Number 1: C3881585; Tolerance: ±2%; Voltage Rating: 50V; Temperature Coefficient: C0G; RoHS: Yes; ComponentLink1Description: Datasheet; ComponentLink1URL: https://wmsc.lcsc.com/wmsc/upload/file/pdf/v2/lcsc/2308111507_Murata-Electronics-GRM1555C1H332GE01D_C3881585.pdf; ComponentLink2Description: JLCPCB Part URL; ComponentLink2URL: https://jlcpcb.com/partdetail/C3881585; ComponentLink3Description: LCSC Part URL; ComponentLink3URL: https://lcsc.com/product-detail/Multilayer-Ceramic-Capacitors-MLCC---SMD-SMT_Murata-Electronics-Murata-Electronics-GRM1555C1H332GE01D_C3881585.html
footprint CAP-0402 (0402 (1005M) Capacitor)
pins: 1, 2

## GRM1555C1H361GA01D
designator C?  Capacitance: 360pF  (hidden comment: *)
Capacitor, Ceramic (MLCC), 360pF, ±2%, 50V, C0G, ±2%, SMD 0402; Manufacturer: Murata Electronics; Manufacturer Part Number: GRM1555C1H361GA01D; Package Size: 0402; JLCPCB Basic Part: No; JLCPCB Part Number: C710845; Supplier 1: LCSC; Category: Capacitors - MLCC; Supplier Part Number 1: C710845; Tolerance: ±2%; Voltage Rating: 50V; Temperature Coefficient: C0G; RoHS: Yes; ComponentLink1Description: Datasheet; ComponentLink1URL: https://wmsc.lcsc.com/wmsc/upload/file/pdf/v2/lcsc/2308111633_Murata-Electronics-GRM1555C1H361GA01D_C710845.pdf; ComponentLink2Description: JLCPCB Part URL; ComponentLink2URL: https://jlcpcb.com/partdetail/C710845; ComponentLink3Description: LCSC Part URL; ComponentLink3URL: https://lcsc.com/product-detail/Multilayer-Ceramic-Capacitors-MLCC---SMD-SMT_Murata-Electronics-Murata-Electronics-GRM1555C1H361GA01D_C710845.html
footprint CAP-0402 (0402 (1005M) Capacitor)
pins: 1, 2

## GRM1555C1H390FA01D
designator C?  Capacitance: 39pF  (hidden comment: *)
Capacitor, Ceramic (MLCC), 39pF, ±1%, 50V, null, ±1%, SMD 0402; Manufacturer: Murata Electronics; Manufacturer Part Number: GRM1555C1H390FA01D; Package Size: 0402; JLCPCB Basic Part: No; JLCPCB Part Number: C3847304; Supplier 1: LCSC; Category: Capacitors - MLCC; Supplier Part Number 1: C3847304; Tolerance: ±1%; Voltage Rating: 50V; Temperature Coefficient: null; RoHS: Yes; ComponentLink1Description: Datasheet; ComponentLink1URL: https://wmsc.lcsc.com/wmsc/upload/file/pdf/v2/lcsc/2308111413_Murata-Electronics-GRM1555C1H390FA01D_C3847304.pdf; ComponentLink2Description: JLCPCB Part URL; ComponentLink2URL: https://jlcpcb.com/partdetail/C3847304; ComponentLink3Description: LCSC Part URL; ComponentLink3URL: https://lcsc.com/product-detail/Multilayer-Ceramic-Capacitors-MLCC---SMD-SMT_Murata-Electronics-Murata-Electronics-GRM1555C1H390FA01D_C3847304.html
footprint CAP-0402 (0402 (1005M) Capacitor)
pins: 1, 2

## GRM1555C1H391FA01D
designator C?  Capacitance: 390pF  (hidden comment: *)
Capacitor, Ceramic (MLCC), 390pF, ±1%, 50V, C0G, ±1%, SMD 0402; Manufacturer: Murata Electronics; Manufacturer Part Number: GRM1555C1H391FA01D; Package Size: 0402; JLCPCB Basic Part: No; JLCPCB Part Number: C162100; Supplier 1: LCSC; Category: Capacitors - MLCC; Supplier Part Number 1: C162100; Tolerance: ±1%; Voltage Rating: 50V; Temperature Coefficient: C0G; RoHS: Yes; ComponentLink1Description: Datasheet; ComponentLink1URL: https://wmsc.lcsc.com/wmsc/upload/file/pdf/v2/lcsc/1811081531_Murata-Electronics-GRM1555C1H391FA01D_C162100.pdf; ComponentLink2Description: JLCPCB Part URL; ComponentLink2URL: https://jlcpcb.com/partdetail/C162100; ComponentLink3Description: LCSC Part URL; ComponentLink3URL: https://lcsc.com/product-detail/Multilayer-Ceramic-Capacitors-MLCC---SMD-SMT_Murata-Electronics-Murata-Electronics-GRM1555C1H391FA01D_C162100.html
footprint CAP-0402 (0402 (1005M) Capacitor)
pins: 1, 2

## GRM1555C1H391GA01D
designator C?  Capacitance: 390pF  (hidden comment: *)
Capacitor, Ceramic (MLCC), 390pF, ±2%, 50V, C0G, ±2%, SMD 0402; Manufacturer: Murata Electronics; Manufacturer Part Number: GRM1555C1H391GA01D; Package Size: 0402; JLCPCB Basic Part: No; JLCPCB Part Number: C437520; Supplier 1: LCSC; Category: Capacitors - MLCC; Supplier Part Number 1: C437520; Tolerance: ±2%; Voltage Rating: 50V; Temperature Coefficient: C0G; RoHS: Yes; ComponentLink1Description: Datasheet; ComponentLink1URL: https://wmsc.lcsc.com/wmsc/upload/file/pdf/v2/lcsc/2304140030_Murata-Electronics-GRM1555C1H391GA01D_C437520.pdf; ComponentLink2Description: JLCPCB Part URL; ComponentLink2URL: https://jlcpcb.com/partdetail/C437520; ComponentLink3Description: LCSC Part URL; ComponentLink3URL: https://lcsc.com/product-detail/Multilayer-Ceramic-Capacitors-MLCC---SMD-SMT_Murata-Electronics-Murata-Electronics-GRM1555C1H391GA01D_C437520.html
footprint CAP-0402 (0402 (1005M) Capacitor)
pins: 1, 2

## GRM1555C1H431GA01D
designator C?  Capacitance: 430pF  (hidden comment: *)
Capacitor, Ceramic (MLCC), 430pF, ±2%, 50V, C0G, ±2%, SMD 0402; Manufacturer: Murata Electronics; Manufacturer Part Number: GRM1555C1H431GA01D; Package Size: 0402; JLCPCB Basic Part: No; JLCPCB Part Number: C3875192; Supplier 1: LCSC; Category: Capacitors - MLCC; Supplier Part Number 1: C3875192; Tolerance: ±2%; Voltage Rating: 50V; Temperature Coefficient: C0G; RoHS: Yes; ComponentLink1Description: Datasheet; ComponentLink1URL: https://wmsc.lcsc.com/wmsc/upload/file/pdf/v2/lcsc/2308111507_Murata-Electronics-GRM1555C1H431GA01D_C3875192.pdf; ComponentLink2Description: JLCPCB Part URL; ComponentLink2URL: https://jlcpcb.com/partdetail/C3875192; ComponentLink3Description: LCSC Part URL; ComponentLink3URL: https://lcsc.com/product-detail/Multilayer-Ceramic-Capacitors-MLCC---SMD-SMT_Murata-Electronics-Murata-Electronics-GRM1555C1H431GA01D_C3875192.html
footprint CAP-0402 (0402 (1005M) Capacitor)
pins: 1, 2

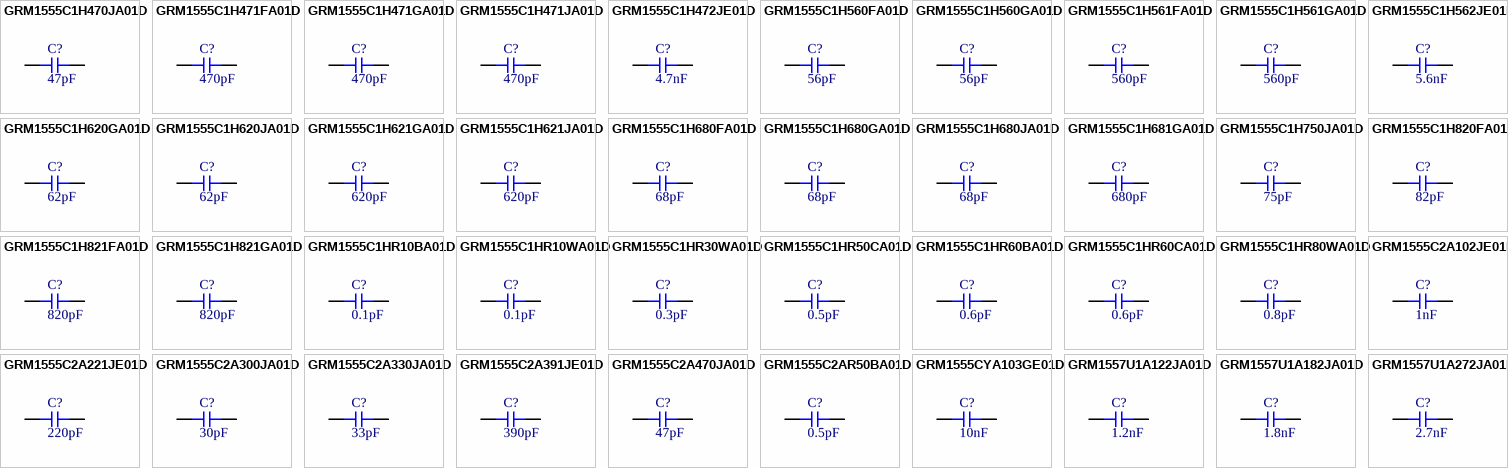
[diagram p74: symbols GRM1555C1H470JA01D to GRM1557U1A272JA01D]

## GRM1555C1H470JA01D
designator C?  Capacitance: 47pF  (hidden comment: *)
Capacitor, Ceramic (MLCC), 47pF, ±5%, 50V, C0G, ±5%, SMD 0402; Manufacturer: Murata Electronics; Manufacturer Part Number: GRM1555C1H470JA01D; Package Size: 0402; JLCPCB Basic Part: No; JLCPCB Part Number: C76970; Supplier 1: LCSC; Category: Capacitors - MLCC; Supplier Part Number 1: C76970; Tolerance: ±5%; Voltage Rating: 50V; Temperature Coefficient: C0G; RoHS: Yes; ComponentLink1Description: Datasheet; ComponentLink1URL: https://wmsc.lcsc.com/wmsc/upload/file/pdf/v2/lcsc/1811081614_Murata-Electronics-GRM1555C1H470JA01D_C76970.pdf; ComponentLink2Description: JLCPCB Part URL; ComponentLink2URL: https://jlcpcb.com/partdetail/C76970; ComponentLink3Description: LCSC Part URL; ComponentLink3URL: https://lcsc.com/product-detail/Multilayer-Ceramic-Capacitors-MLCC---SMD-SMT_Murata-Electronics-Murata-Electronics-GRM1555C1H470JA01D_C76970.html
footprint CAP-0402 (0402 (1005M) Capacitor)
pins: 1, 2